# Altium footprint library Sheye-Relay.PcbLib: 13 footprints
Each footprint in its own frame and in the unit in brackets; x right, y up, seen from the top. Pads: shape width x height; smd on the part's side, far side on the other; paste and mask are expansions set on the pad; w line width, h text height; cw(c..) or ccw(c..) is an arc to the next point about the centre after c.
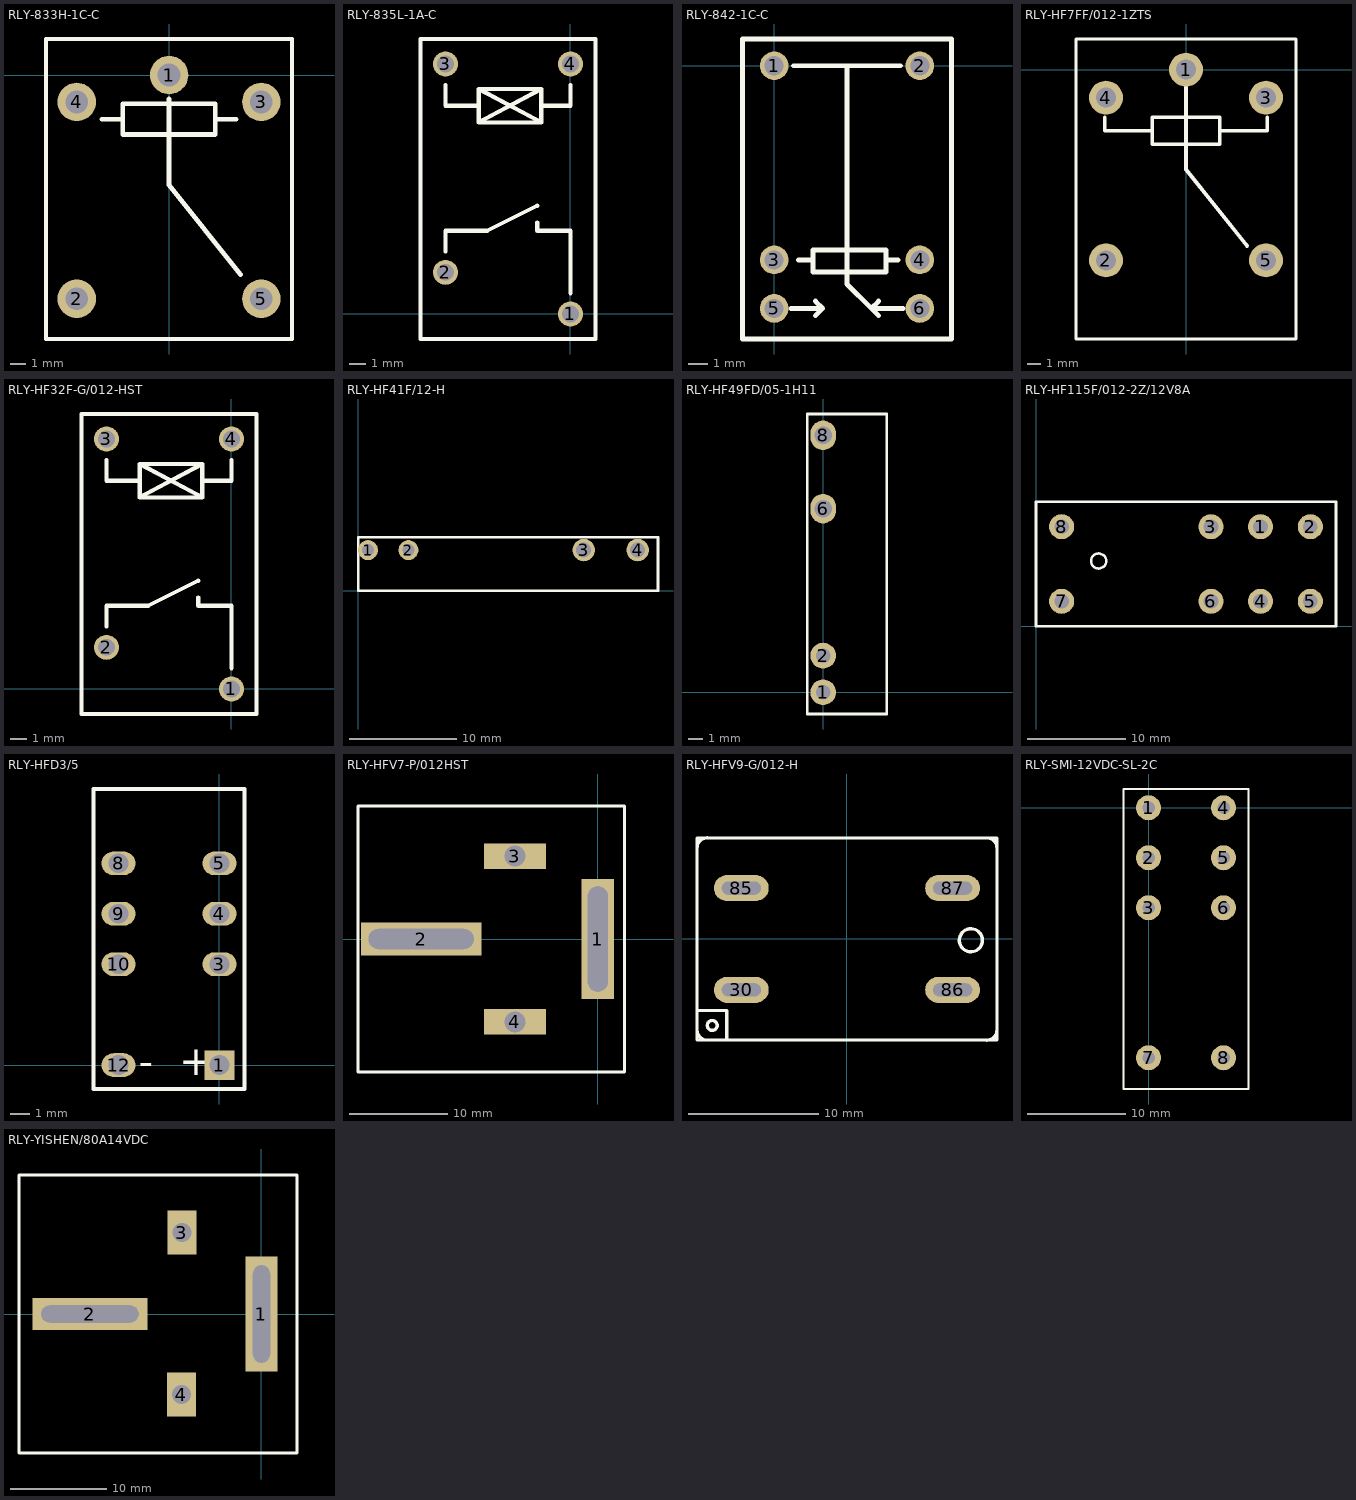
[diagram p0: the footprints below, top view; thin cyan lines are the x and y axes]

## RLY-833H-1C-C [mil]
pads (5):
  round 100 hole 59.06: 1(0,0) 4(-240,-70)
  round 100 hole 59.05: 2(-240,-581.81) 3(240,-70) 5(240,-581.81)
Top Overlay:
  lines w10: -320.17,-686.34 319.83,-686.34 319.83,93.66 -320.17,93.66 -320.17,-686.34
  lines w12: -220.17,-106.34 -220.17,-66.34 ; -175,-114.53 -120.17,-114.53 ; -0.17,-61.81 -0.17,-286.34 185.59,-518.53 ; 119.83,-114.53 175,-114.53 ; 219.83,-106.34 219.83,-66.34 ; -120.17,-154.53 119.83,-154.53 119.83,-74.53 -120.17,-74.53 -120.17,-154.53
3D body: height 39.37, standoff -78.74, extent -260,-601.81 -220.79,-562.52
3D body: height 39.37, standoff -78.74, extent 220,-601.81 259.21,-562.52
3D body: height 39.37, standoff -78.74, extent 220,-81.81 259.21,-42.52
3D body: height 39.37, standoff -78.74, extent -20,-11.81 19.21,27.48
3D body: height 39.37, standoff -78.74, extent -260,-81.81 -220.79,-42.52
3D body: height 649.61, standoff 0, extent -320,-686.81 320,93.19

## RLY-835L-1A-C [mil]
pads (4):
  round 60 hole 40: 1(0,0) 2(-300,100) 3(-300,600) 4(0,600)
Top Overlay:
  lines w10: -300,150 -300,200 -200,200 -80,260 ; -300,550 -300,500 -220,500 ; -80,220 -80,200 0,200 0,50 ; -70,500 0,500 0,550 ; -220,460 -70,540 ; -220,460 -70,460 ; -220,460 -220,540 ; -220,540 -70,460 ; -220,540 -70,540 ; -70,460 -70,540 ; -360,-60 60,-60 60,660 -360,660 -360,-60
3D body: height 39.37, standoff -78.74, extent -20,-20 19.21,19.29
3D body: height 39.37, standoff -78.74, extent -320,80 -280.79,119.29
3D body: height 39.37, standoff -78.74, extent -20,580 19.21,619.29
3D body: height 39.37, standoff -78.74, extent -320,580 -280.79,619.29
3D body: height 602.36, standoff 0, extent -360,-60 60,660

## RLY-842-1C-C [mm]
pads (6):
  round 1.5 hole 1: 1(0,0) 2(7.62,0) 3(0,-10.16) 4(7.62,-10.16) 5(0,-12.7) 6(7.62,-12.7)
Top Overlay:
  lines w0.254: 0.889,-12.7 2.54,-12.7 ; 1.016,0 6.604,0 ; 1.27,-10.16 2.032,-10.16 ; 2.159,-13.081 2.54,-12.7 ; 2.159,-12.319 2.54,-12.7 ; 3.81,0 3.81,-11.43 5.08,-12.7 ; 5.461,-13.081 5.08,-12.7 ; 5.461,-12.319 5.08,-12.7 ; 5.842,-10.16 6.477,-10.16 ; 6.731,-12.7 5.08,-12.7 ; -1.651,-14.3 9.271,-14.3 9.271,1.397 -1.651,1.397 -1.651,-14.3 ; 2.032,-10.795 2.032,-9.652 5.842,-9.652 5.842,-10.795 2.032,-10.795
3D body: height 12, standoff 0, extent -1.651,-14.351 9.271,1.397
3D body: height 1, standoff -2, extent -0.508,-0.508 0.488,0.49
3D body: height 1, standoff -2, extent 7.112,-0.508 8.108,0.49
3D body: height 1, standoff -2, extent -0.508,-10.668 0.488,-9.67
3D body: height 1, standoff -2, extent 7.112,-10.668 8.108,-9.67
3D body: height 1, standoff -2, extent -0.508,-13.208 0.488,-12.21
3D body: height 1, standoff -2, extent 7.112,-13.208 8.108,-12.21

## RLY-HF7FF/012-1ZTS [mm] "7FF/012-1ZTS"
pads (5):
  round 2.54 hole 1.5: 1(0,0) 2(-6,-14.3) 3(6,-2.1) 4(-6,-2.1) 5(6,-14.3)
Top Overlay:
  lines w0.254: -6.096,-3.556 -6.096,-4.572 -2.54,-4.572 ; 2.54,-4.572 6.096,-4.572 6.096,-3.556 ; -8.25,-20.2 -8.25,2.3 8.25,2.3 8.25,-20.2 -8.25,-20.2 ; -2.54,-5.588 2.54,-5.588 2.54,-3.556 -2.032,-3.556 -2.54,-3.556 -2.54,-5.588
  lines w0.305: -0.004,-0.369 -0.004,-7.481 4.572,-13.208 ; 5.584,-2.909 5.584,-1.893
3D body: height 1, standoff -2, extent 5.492,-14.808 6.488,-13.81
3D body: height 1, standoff -2, extent -6.508,-14.808 -5.512,-13.81
3D body: height 1, standoff -2, extent 5.492,-2.608 6.488,-1.61
3D body: height 1, standoff -2, extent -0.508,-0.508 0.488,0.49
3D body: height 1, standoff -2, extent -6.508,-2.608 -5.512,-1.61
3D body: height 16.5, standoff 0, extent -8.255,-20.193 8.255,2.413

## RLY-HF32F-G/012-HST [mil] "HF32F-G/012-HST"
pads (4):
  round 60 hole 40: 1(0,0) 2(-300,100) 3(-300,600) 4(0,600)
Top Overlay:
  lines w10: -300,150 -300,200 -200,200 -80,260 ; -300,550 -300,500 -220,500 ; -80,220 -80,200 0,200 0,50 ; -70,500 0,500 0,550 ; -220,460 -70,540 ; -220,460 -70,460 ; -220,460 -220,540 ; -220,540 -70,460 ; -220,540 -70,540 ; -70,460 -70,540 ; -360,-60 60,-60 60,660 -360,660 -360,-60
3D body: height 602.36, standoff 0, extent -360,-60 60,660
3D body: height 39.37, standoff -78.74, extent -320,580 -280.79,619.29
3D body: height 39.37, standoff -78.74, extent -20,580 19.21,619.29
3D body: height 39.37, standoff -78.74, extent -320,80 -280.79,119.29
3D body: height 39.37, standoff -78.74, extent -20,-20 19.21,19.29

## RLY-HF41F/12-H [mm]
pads (4):
  round 1.87 hole 1.1: 1(0.9,3.8) 2(4.68,3.8)
  round 2.1 hole 1.4: 3(21.06,3.8) 4(26.1,3.8)
Top Overlay:
  lines w0.254: 0,0 28,0 28,5 0,5 0,0
3D body: height 0, standoff -3.5, extent 25.645,3.556 26.534,4.064
3D body: height 0, standoff -3.5, extent 20.605,3.556 21.494,4.064
3D body: height 0, standoff -3.5, extent 4.225,3.556 5.114,4.064
3D body: height 0, standoff -3.5, extent 0.445,3.556 1.333,4.064
3D body: height 15, standoff 0, extent 0,0 27.94,5.08

## RLY-HF49FD/05-1H11 [mil] "HF49FD/05-1H11"
pads (4):
  round 70 hole 39.37: 1(0,0) 2(0,100)
  oval 70x80 hole 47.24: 6(0,500) 8(0,700)
Top Overlay:
  lines w8: -43.31,-59.06 -43.31,757.87 173.23,757.87 173.23,-59.06 -43.31,-59.06
3D body: height 39.37, standoff -78.74, extent -20,-20 19.21,19.29
3D body: height 39.37, standoff -78.74, extent -20,80 19.21,119.29
3D body: height 39.37, standoff -78.74, extent -20,480 19.21,519.29
3D body: height 39.37, standoff -78.74, extent -20,680 19.21,719.29
3D body: height 492.13, standoff 0, extent -45,-60 170,755

## RLY-HF115F/012-2Z/12V8A [mm]
pads (8):
  round 2.54 hole 1.5: 1(22.76,10.08) 2(27.8,10.08) 3(17.72,10.08) 4(22.76,2.52) 5(27.8,2.52) 6(17.72,2.52) 7(2.6,2.52) 8(2.6,10.08)
Top Overlay:
  circle w0.254: c6.35,6.604 r0.762
  lines w0.254: 0,0 30.4,0 30.4,12.6 0,12.6 0,0
3D body: height 0.55, standoff 0, extent 0,0 30.4,12.6

## RLY-HFD3/5 [mm] "HFD3/5"
pads (8):
  rect 1.5x1.5 hole 1: 1(0,0)
  oval 1.7x1.2 hole 1: 3(0,5.08) 4(0,7.62) 5(0,10.16) 8(-5.08,10.16) 9(-5.08,7.62) 10(-5.08,5.08) 12(-5.08,0)
Top Overlay:
  lines w0.203: -6.34,-1.2 1.26,-1.2 1.26,13.9 -6.34,13.9 -6.34,-1.2
  text "-" at -4.064,-1.016 h2.54
  text "+" at -2.032,-1.016 h2.54
3D body: height 9, standoff 0, extent -6.35,-1.143 1.27,13.843
3D body: height 1, standoff -2, extent -5.588,9.652 -4.592,10.65
3D body: height 1, standoff -2, extent -5.588,7.112 -4.592,8.11
3D body: height 1, standoff -2, extent -5.588,4.572 -4.592,5.57
3D body: height 1, standoff -2, extent -0.508,4.572 0.488,5.57
3D body: height 1, standoff -2, extent -0.508,7.112 0.488,8.11
3D body: height 1, standoff -2, extent -0.508,9.652 0.488,10.65
3D body: height 1, standoff -2, extent -5.588,-0.508 -4.592,0.49
3D body: height 1, standoff -2, extent -0.508,-0.508 0.488,0.49

## RLY-HFV7-P/012HST [mm] "HFV7-P/012HST"
height 26.5
pads (4):
  rect 3.302x12.192 hole 2.032 slot 10.668 at 90 deg: 1(0,0)
  rect 12.192x3.302 hole 2.032 slot 10.668 at 0 deg: 2(-17.9,0)
  rect 6.3x2.6 hole 2.1: 3(-8.4,8.4) 4(-8.4,-8.4)
Top Overlay:
  lines w0.305: -24.3,-13.5 2.7,-13.5 2.7,13.5 -24.3,13.5 -24.3,-13.5
3D body: height 3, standoff -2, extent -0.889,-4.452 0.889,4.438
3D body: height 3, standoff -2, extent -22.352,-0.889 -13.462,0.889
3D body: height 1, standoff -2, extent -9.144,7.62 -7.55,9.217
3D body: height 1, standoff -2, extent -9.144,-9.144 -7.55,-7.547
3D body: height 25, standoff 0, extent -24.384,-13.589 2.794,13.589

## RLY-HFV9-G/012-H [mm]
pads (4):
  oval 4.2x2 hole 1 slot 3 at 0 deg: 30(-8.1,-3.9) 85(-8.1,3.9) 86(8.1,-3.9) 87(8.1,3.9)
Top Overlay:
  circle w0.254: c-10.333,-6.626 r0.381
  circle w0.254: c9.5,-0.1 r0.885
  lines w0.254: -11.5,-5.483 -9.226,-5.483 -9.226,-7.75 ; -11.499,-6.979 ccw(c-10.722,-6.976) -10.719,-7.752 ; -11.495,6.974 cw(c-10.718,6.977) -10.722,7.754 ; 10.724,7.75 cw(c10.728,6.973) 11.504,6.977 ; 10.727,-7.756 ccw(c10.724,-6.98) 11.5,-6.976 ; -11.5,-7.75 -11.5,7.75 11.5,7.75 11.5,-7.75 -11.5,-7.75
3D body: height 25, standoff 0, extent -11.506,-7.747 11.506,7.747

## RLY-SMI-12VDC-SL-2C [mil] "SMI-12VDC-SL-2C"
pads (8):
  round 100 hole 50: 1(0,0) 2(0,-200) 3(0,-400) 4(300,0) 5(300,-200) 6(300,-400) 7(0,-1000) 8(300,-1000)
Top Overlay:
  lines w8: -100,-1125 -100,75 400,75 400,-1125 -100,-1125
3D body: height 39.37, standoff -78.74, extent 280,-1020 319.21,-980.71
3D body: height 39.37, standoff -78.74, extent -20,-1020 19.21,-980.71
3D body: height 39.37, standoff -78.74, extent 280,-420 319.21,-380.71
3D body: height 39.37, standoff -78.74, extent -20,-420 19.21,-380.71
3D body: height 39.37, standoff -78.74, extent 280,-220 319.21,-180.71
3D body: height 39.37, standoff -78.74, extent -20,-220 19.21,-180.71
3D body: height 39.37, standoff -78.74, extent 280,-20 319.21,19.29
3D body: height 39.37, standoff -78.74, extent -20,-20 19.21,19.29
3D body: height 787.4, standoff 0, extent -100,-1125 400,75

## RLY-YISHEN/80A14VDC [mm]
pads (4):
  rect 3.3x12 hole 1.778 slot 10.16 at 90 deg: 1(0,0)
  rect 12x3.3 hole 1.778 slot 10.16 at 0 deg: 2(-17.9,0)
  rect 3.048x4.572 hole 2: 3(-8.3,8.5) 4(-8.353,-8.408)
Top Overlay:
  lines w0.305: -25.3,-14.5 3.7,-14.5 3.7,14.5 -25.3,14.5 -25.3,-14.5
3D body: height 1, standoff -2, extent -9.097,-9.188 -7.503,-7.591
3D body: height 1, standoff -2, extent -9.144,7.701 -7.55,9.297
3D body: height 25, standoff 0, extent -25.273,-14.478 3.683,14.478